# Altium footprint library QFN.PcbLib: 37 footprints (part 1 of 3)
Each footprint in its own frame and in the unit in brackets; x right, y up, seen from the top. Pads: shape width x height; smd on the part's side, far side on the other; paste and mask are expansions set on the pad; w line width, h text height; cw(c..) or ccw(c..) is an arc to the next point about the centre after c.
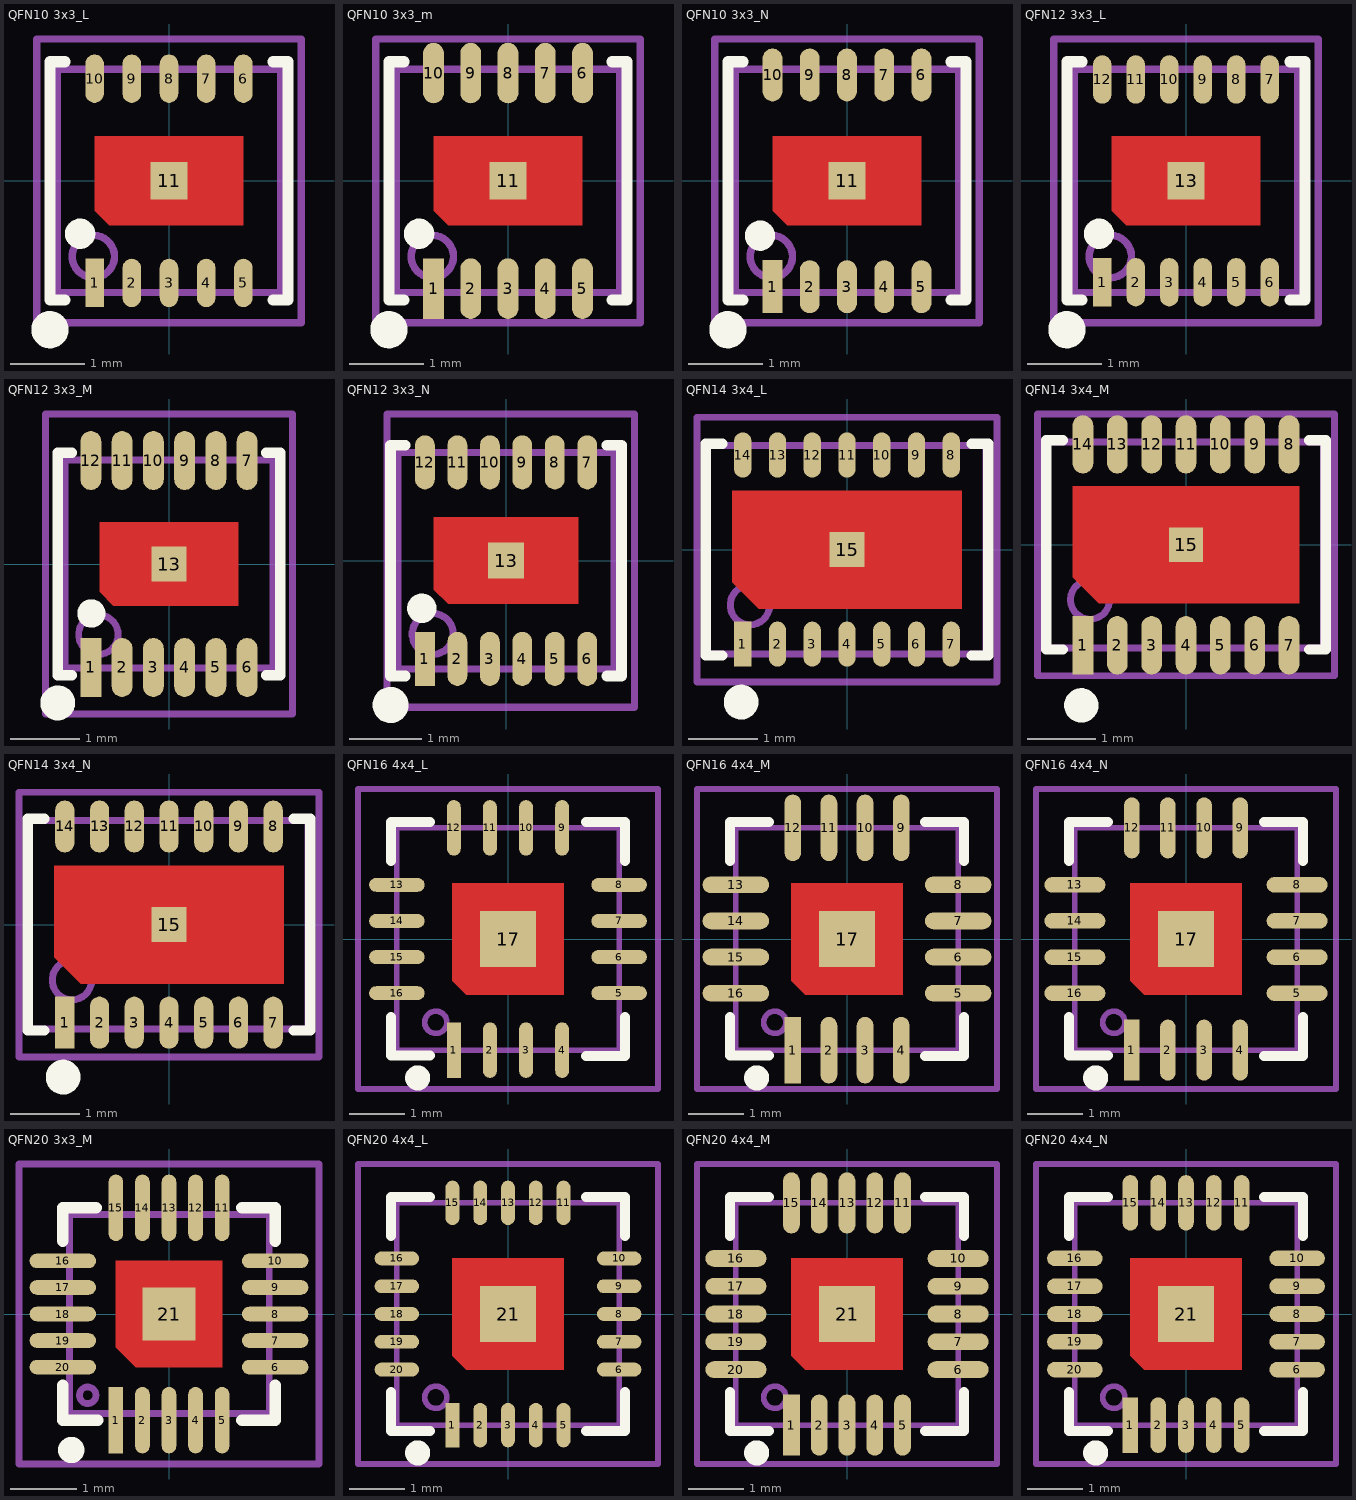
[diagram p0: the footprints below, top view; thin cyan lines are the x and y axes]

## QFN10 3x3_L [mm] "10脚，长x宽x高：3x3x0.6mm，脚距：0.5mm"
pads (11):
  rect 0.25x0.65 smd: 1(-1,-1.372)
  oval 0.25x0.65 smd: 2(-0.5,-1.372) 3(0,-1.372) 4(0.5,-1.372) 5(1,-1.372) 6(1,1.372) 7(0.5,1.372) 8(0,1.372) 9(-0.5,1.372) 10(-1,1.372)
  rect 0.5x0.5 smd: 11(0,0)
Top Layer:
  region: -1,0.6 1,0.6 1,-0.6 -0.8,-0.6 -1,-0.4
Top Overlay:
  circle w0.25: c-1.6,-2 r0.125
  circle w0.203: c-1.194,-0.711 r0.102
  lines w0.15: -1.397,-1.6 -1.6,-1.6 -1.6,1.6 -1.397,1.6 ; 1.397,-1.6 1.6,-1.6 1.6,1.6 1.397,1.6
Top Solder:
  region: -1,0.6 1,0.6 1,-0.6 -0.8,-0.6 -1,-0.4
Mechanical 13:
  circle w0.1: c-1.016,-1.016 r0.284
  lines w0.1: 1.5,-1.5 1.5,1.5 ; 1.5,-1.5 1.5,-1.5 ; 1.5,-1.5 -1.49,-1.5 -1.5,-1.51 -1.5,1.5 1.5,1.5 ; 1.5,1.5 1.5,1.5
Mechanical 15:
  circle w0.05: c0,0 r0.35
  lines w0.05: -0.5,0 0.5,0 ; 0,-0.5 0,0.5
  lines w0.1: -1.778,-1.905 1.778,-1.905 1.778,1.905 -1.778,1.905 -1.778,-1.905
3D body: height 0.63, standoff 0.01, extent -1.5,-1.52 1.5,1.52

## QFN10 3x3_m [mil] "10脚，长x宽x高：3x3x0.6mm，脚距：0.5mm"
pads (11):
  rect 11x32 smd: 1(-39.37,-57)
  oval 11x32 smd: 2(-19.68,-57) 3(0,-57) 4(19.68,-57) 5(39.37,-57) 6(39.37,57) 7(19.68,57) 8(0,57) 9(-19.68,57) 10(-39.37,57)
  rect 19.68x19.68 smd: 11(0,0)
Top Layer:
  region: -39.37,23.62 39.37,23.62 39.37,-23.62 -31.5,-23.62 -39.37,-15.75
Top Overlay:
  circle w8: c-47,-28 r4
  circle w9.84: c-62.99,-78.74 r4.92
  lines w5.91: -55,-62.99 -62.99,-62.99 -62.99,62.99 -55,62.99 ; 55,-62.99 62.99,-62.99 62.99,62.99 55,62.99
Top Solder:
  region: -39.37,23.62 39.37,23.62 39.37,-23.62 -31.5,-23.62 -39.37,-15.75
Mechanical 13:
  circle w3.94: c-40,-40 r11.18
  lines w3.94: 59.06,-59.06 -58.66,-59.06 -59.06,-59.45 -59.06,59.06 59.05,59.06 ; 59.05,-59.05 59.06,-59.06 ; 59.05,-59.05 59.05,59.05 ; 59.05,59.06 59.05,59.05
Mechanical 15:
  circle w1.97: c0,0 r13.78
  lines w1.97: -19.68,0 19.68,0 ; 0,-19.68 0,19.68
  lines w3.94: -70,-75 -70,75 70,75 70,-75 -70,-75
3D body: height 24.8, standoff 0.39, extent -59.06,-59.85 59.05,59.84

## QFN10 3x3_N [mil] "10脚，长x宽x高：3x3x0.6mm，脚距：0.5mm"
pads (11):
  rect 10.5x28 smd: 1(-39.37,-56)
  oval 10.5x28 smd: 2(-19.68,-56) 3(0,-56) 4(19.68,-56) 5(39.37,-56) 6(39.37,56) 7(19.68,56) 8(0,56) 9(-19.68,56) 10(-39.37,56)
  rect 19.68x19.68 smd: 11(0,0)
Top Layer:
  region: -39.37,23.62 39.37,23.62 39.37,-23.62 -31.5,-23.62 -39.37,-15.75
Top Overlay:
  circle w8: c-46,-29 r4
  circle w9.84: c-62.99,-78.74 r4.92
  lines w5.91: -55,-62.99 -62.99,-62.99 -62.99,62.99 -55,62.99 ; 55,-62.99 62.99,-62.99 62.99,62.99 55,62.99
Top Solder:
  region: -39.37,23.62 39.37,23.62 39.37,-23.62 -31.5,-23.62 -39.37,-15.75
Mechanical 13:
  circle w3.94: c-40,-40 r11.18
  lines w3.94: 59.06,-59.06 -58.66,-59.06 -59.06,-59.45 -59.06,59.06 59.05,59.06 ; 59.05,-59.05 59.06,-59.06 ; 59.05,-59.05 59.05,59.05 ; 59.05,59.06 59.05,59.05
Mechanical 15:
  circle w1.97: c0,0 r13.78
  lines w1.97: -19.68,0 19.68,0 ; 0,-19.68 0,19.68
  lines w3.94: -70,-75 -70,75 70,75 70,-75 -70,-75
3D body: height 24.8, standoff 0.39, extent -59.06,-59.85 59.05,59.84

## QFN12 3x3_L [mm] "12脚，长x宽x高：3x3x0.6mm，脚距：0.45mm"
pads (13):
  rect 0.25x0.65 smd: 1(-1.125,-1.362)
  oval 0.25x0.65 smd: 2(-0.675,-1.362) 3(-0.225,-1.362) 4(0.225,-1.362) 5(0.675,-1.362) 6(1.125,-1.362) 7(1.125,1.362) 8(0.675,1.362) 9(0.225,1.362) 10(-0.225,1.362) 11(-0.675,1.362) 12(-1.125,1.362)
  rect 0.5x0.5 smd: 13(0,0)
Top Layer:
  region: -1,0.6 1,0.6 1,-0.6 -0.8,-0.6 -1,-0.4
Top Overlay:
  circle w0.203: c-1.168,-0.711 r0.102
  circle w0.25: c-1.6,-2 r0.125
  lines w0.15: -1.397,-1.6 -1.6,-1.6 -1.6,1.6 -1.397,1.6 ; 1.397,-1.6 1.6,-1.6 1.6,1.6 1.397,1.6
Top Solder:
  region: -1,0.6 1,0.6 1,-0.6 -0.8,-0.6 -1,-0.4
Mechanical 13:
  circle w0.1: c-1.016,-1.016 r0.284
  lines w0.1: 1.5,-1.5 1.5,1.5 ; 1.5,-1.5 1.5,-1.5 ; 1.5,-1.5 -1.49,-1.5 -1.5,-1.51 -1.5,1.5 1.5,1.5 ; 1.5,1.5 1.5,1.5
Mechanical 15:
  circle w0.05: c0,0 r0.35
  lines w0.05: -0.5,0 0.5,0 ; 0,-0.5 0,0.5
  lines w0.1: -1.778,-1.905 1.778,-1.905 1.778,1.905 -1.778,1.905 -1.778,-1.905
3D body: height 0.63, standoff 0, extent -1.5,-1.501 1.5,1.501

## QFN12 3x3_M [mm] "12脚，长x宽x高：3x3x0.6mm，脚距：0.45mm"
pads (13):
  rect 0.3x0.85 smd: 1(-1.125,-1.489)
  oval 0.3x0.85 smd: 2(-0.675,-1.489) 3(-0.225,-1.489) 4(0.225,-1.489) 5(0.675,-1.489) 6(1.125,-1.489) 7(1.125,1.489) 8(0.675,1.489) 9(0.225,1.489) 10(-0.225,1.489) 11(-0.675,1.489) 12(-1.125,1.489)
  rect 0.5x0.5 smd: 13(0,0)
Top Layer:
  region: -1,0.6 1,0.6 1,-0.6 -0.8,-0.6 -1,-0.4
Top Overlay:
  circle w0.203: c-1.118,-0.711 r0.102
  circle w0.25: c-1.6,-2 r0.125
  lines w0.15: -1.397,-1.6 -1.6,-1.6 -1.6,1.6 -1.397,1.6 ; 1.397,-1.6 1.6,-1.6 1.6,1.6 1.397,1.6
Top Solder:
  region: -1,0.6 1,0.6 1,-0.6 -0.8,-0.6 -1,-0.4
Mechanical 13:
  circle w0.1: c-1.016,-1.016 r0.284
  lines w0.1: 1.5,-1.5 -1.49,-1.5 -1.5,-1.51 -1.5,1.5 1.5,1.5 ; 1.5,-1.5 1.5,-1.5 ; 1.5,-1.5 1.5,1.5 ; 1.5,1.5 1.5,1.5
Mechanical 15:
  circle w0.05: c0,0 r0.35
  lines w0.05: -0.5,0 0.5,0 ; 0,-0.5 0,0.5
  lines w0.1: -1.778,-2.159 1.778,-2.159 1.778,2.159 -1.778,2.159 -1.778,-2.159
3D body: height 0.63, standoff 0, extent -1.5,-1.501 1.5,1.501

## QFN12 3x3_N [mm] "12脚，长x宽x高：3x3x0.6mm，脚距：0.45mm"
pads (13):
  rect 0.275x0.75 smd: 1(-1.125,-1.362)
  oval 0.275x0.75 smd: 2(-0.675,-1.362) 3(-0.225,-1.362) 4(0.225,-1.362) 5(0.675,-1.362) 6(1.125,-1.362) 7(1.125,1.362) 8(0.675,1.362) 9(0.225,1.362) 10(-0.225,1.362) 11(-0.675,1.362) 12(-1.125,1.362)
  rect 0.5x0.5 smd: 13(0,0)
Top Layer:
  region: -1,0.6 1,0.6 1,-0.6 -0.8,-0.6 -1,-0.4
Top Overlay:
  circle w0.203: c-1.168,-0.66 r0.102
  circle w0.25: c-1.6,-2 r0.125
  lines w0.15: -1.397,-1.6 -1.6,-1.6 -1.6,1.6 -1.397,1.6 ; 1.397,-1.6 1.6,-1.6 1.6,1.6 1.397,1.6
Top Solder:
  region: -1,0.6 1,0.6 1,-0.6 -0.8,-0.6 -1,-0.4
Mechanical 13:
  circle w0.1: c-1.016,-1.016 r0.284
  lines w0.1: 1.5,-1.5 1.5,1.5 ; 1.5,-1.5 1.5,-1.5 ; 1.5,-1.5 -1.49,-1.5 -1.5,-1.51 -1.5,1.5 1.5,1.5 ; 1.5,1.5 1.5,1.5
Mechanical 15:
  circle w0.05: c0,0 r0.35
  lines w0.05: -0.5,0 0.5,0 ; 0,-0.5 0,0.5
  lines w0.1: -1.651,-2.032 1.778,-2.032 1.778,2.032 -1.651,2.032 -1.651,-2.032
3D body: height 0.63, standoff 0, extent -1.5,-1.501 1.5,1.501

## QFN14 3x4_L [mm] "14脚，长x宽x高：3x4x0.9mm，脚距：0.5mm"
pads (15):
  rect 0.25x0.65 smd: 1(-1.5,-1.361)
  oval 0.25x0.65 smd: 2(-1,-1.361) 3(-0.5,-1.361) 4(0,-1.361) 5(0.5,-1.361) 6(1,-1.361) 7(1.5,-1.361) 8(1.5,1.361) 9(1,1.361) 10(0.5,1.361) 11(0,1.361) 12(-0.5,1.361) 13(-1,1.361) 14(-1.5,1.361)
  rect 0.5x0.5 smd: 15(0,0)
Top Layer:
  region: -1.65,0.85 -1.65,-0.469 -1.269,-0.85 1.65,-0.85 1.65,0.85
Top Overlay:
  circle w0.25: c-1.524,-2.195 r0.125
  lines w0.15: -1.793,-1.524 -2.032,-1.524 -2.032,1.524 -1.793,1.524 ; 1.793,-1.524 2.032,-1.524 2.032,1.524 1.793,1.524
Top Solder:
  region: -1.65,0.85 -1.65,-0.469 -1.269,-0.85 1.65,-0.85 1.65,0.85
Mechanical 13:
  circle w0.1: c-1.397,-0.798 r0.284
  lines w0.1: -2.032,-1.5 -1.49,-1.5 2,-1.5 2,0.682 2.001,0.683 2.001,1.5 -2.032,1.5 -2.032,-1.5
Mechanical 15:
  circle w0.05: c0,0 r0.35
  lines w0.05: -0.5,0 0.5,0 ; 0,-0.5 0,0.5
  lines w0.1: -2.159,-1.905 2.159,-1.905 2.159,1.905 -2.159,1.905 -2.159,-1.905
3D body: height 0.93, standoff 0, extent -2,-1.501 2,1.501

## QFN14 3x4_M [mm] "14脚，长x宽x高：3x4x0.9mm，脚距：0.5mm"
pads (15):
  rect 0.3x0.85 smd: 1(-1.5,-1.462)
  oval 0.3x0.85 smd: 2(-1,-1.462) 3(-0.5,-1.462) 4(0,-1.462) 5(0.5,-1.462) 6(1,-1.462) 7(1.5,-1.462) 8(1.5,1.463) 9(1,1.463) 10(0.5,1.463) 11(0,1.463) 12(-0.5,1.463) 13(-1,1.463) 14(-1.5,1.463)
  rect 0.5x0.5 smd: 15(0,0)
Top Layer:
  region: -1.65,0.85 -1.65,-0.469 -1.269,-0.85 1.65,-0.85 1.65,0.85
Top Overlay:
  circle w0.25: c-1.524,-2.337 r0.125
  lines w0.15: -1.793,-1.524 -2.032,-1.524 -2.032,1.524 -1.793,1.524 ; 1.793,-1.524 2.032,-1.524 2.032,1.524 1.793,1.524
Top Solder:
  region: -1.65,0.85 -1.65,-0.469 -1.269,-0.85 1.65,-0.85 1.65,0.85
Mechanical 13:
  circle w0.1: c-1.397,-0.798 r0.284
  lines w0.1: -2.032,-1.5 -1.49,-1.5 2,-1.5 2,0.682 2.001,0.683 2.001,1.5 -2.032,1.5 -2.032,-1.5
Mechanical 15:
  circle w0.05: c0,0 r0.35
  lines w0.05: -0.5,0 0.5,0 ; 0,-0.5 0,0.5
  lines w0.1: -2.159,-1.905 2.159,-1.905 2.159,1.905 -2.159,1.905 -2.159,-1.905
3D body: height 0.93, standoff 0, extent -2,-1.501 2,1.501

## QFN14 3x4_N [mm] "14脚，长x宽x高：3x4x0.9mm，脚距：0.5mm"
pads (15):
  rect 0.275x0.75 smd: 1(-1.5,-1.412)
  oval 0.275x0.75 smd: 2(-1,-1.412) 3(-0.5,-1.412) 4(0,-1.412) 5(0.5,-1.412) 6(1,-1.412) 7(1.5,-1.412) 8(1.5,1.412) 9(1,1.412) 10(0.5,1.412) 11(0,1.412) 12(-0.5,1.412) 13(-1,1.412) 14(-1.5,1.412)
  rect 0.5x0.5 smd: 15(0,0)
Top Layer:
  region: -1.65,0.85 -1.65,-0.469 -1.269,-0.85 1.65,-0.85 1.65,0.85
Top Overlay:
  circle w0.25: c-1.524,-2.195 r0.125
  lines w0.15: -1.793,-1.524 -2.032,-1.524 -2.032,1.524 -1.793,1.524 ; 1.793,-1.524 2.032,-1.524 2.032,1.524 1.793,1.524
Top Solder:
  region: -1.65,0.85 -1.65,-0.469 -1.269,-0.85 1.65,-0.85 1.65,0.85
Mechanical 13:
  circle w0.1: c-1.397,-0.798 r0.284
  lines w0.1: -2.032,-1.5 -2.032,1.5 2.001,1.5 2.001,0.683 2,0.682 2,-1.5 -1.49,-1.5 -2.032,-1.5
Mechanical 15:
  circle w0.05: c0,0 r0.35
  lines w0.05: -0.5,0 0.5,0 ; 0,-0.5 0,0.5
  lines w0.1: -2.159,-1.905 -2.159,1.905 2.159,1.905 2.159,-1.905 -2.159,-1.905
3D body: height 0.93, standoff 0, extent -2,-1.501 2,1.501

## QFN16 4x4_L [mm] "16脚，长x宽x高：4x4x0.8mm，脚距：0.65mm"
pads (17):
  rect 0.25x1 smd: 1(-0.975,-2)
  oval 0.25x1 smd: 2(-0.325,-2) 3(0.325,-2) 4(0.975,-2) 9(0.975,2) 10(0.325,2) 11(-0.325,2) 12(-0.975,2)
  oval 1x0.25 smd: 5(2,-0.975) 6(2,-0.325) 7(2,0.325) 8(2,0.975) 13(-2,0.975) 14(-2,0.325) 15(-2,-0.325) 16(-2,-0.975)
  rect 1x1 smd: 17(0,0)
Top Layer:
  region: -1,1 1,1 1,-1 -0.75,-1 -1,-0.75
Top Overlay:
  circle w0.25: c-1.625,-2.5 r0.1
  lines w0.178: -2.106,-1.404 -2.106,-2.1 -1.404,-2.1 ; -2.106,1.404 -2.106,2.106 -1.404,2.106 ; 1.404,-2.106 2.106,-2.106 2.106,-1.404 ; 1.404,2.106 2.106,2.106 2.106,1.404
Top Solder:
  region: -1,1 1,1 1,-1 -0.75,-1 -1,-0.75
Mechanical 13:
  circle w0.1: c-1.3,-1.5 r0.2
  lines w0.1: -2,-2 -2,2 2,2 2,-2 -2,-2
Mechanical 15:
  circle w0.05: c0,0 r0.35
  lines w0.05: -0.5,0 0.5,0 ; 0,-0.5 0,0.5
  lines w0.1: -2.7,-2.7 2.7,-2.7 2.7,2.7 -2.7,2.7 -2.7,-2.7
3D body: height 0.75, standoff -0.05, extent -2.01,-2.01 2.01,2.01

## QFN16 4x4_M [mm] "16脚，长x宽x高：4x4x0.8mm，脚距：0.65mm"
pads (17):
  rect 0.3x1.2 smd: 1(-0.975,-2)
  oval 0.3x1.2 smd: 2(-0.325,-2) 3(0.325,-2) 4(0.975,-2) 9(0.975,2) 10(0.325,2) 11(-0.325,2) 12(-0.975,2)
  oval 1.2x0.3 smd: 5(2,-0.975) 6(2,-0.325) 7(2,0.325) 8(2,0.975) 13(-2,0.975) 14(-2,0.325) 15(-2,-0.325) 16(-2,-0.975)
  rect 1x1 smd: 17(0,0)
Top Layer:
  region: -1,1 1,1 1,-1 -0.75,-1 -1,-0.75
Top Overlay:
  circle w0.25: c-1.625,-2.5 r0.1
  lines w0.178: -2.106,-1.404 -2.106,-2.1 -1.404,-2.1 ; -2.106,1.404 -2.106,2.106 -1.404,2.106 ; 1.404,-2.106 2.106,-2.106 2.106,-1.404 ; 1.404,2.106 2.106,2.106 2.106,1.404
Top Solder:
  region: -1,1 1,1 1,-1 -0.75,-1 -1,-0.75
Mechanical 13:
  circle w0.1: c-1.3,-1.5 r0.2
  lines w0.1: -2,-2 2,-2 2,2 -2,2 -2,-2
Mechanical 15:
  circle w0.05: c0,0 r0.35
  lines w0.05: -0.5,0 0.5,0 ; 0,-0.5 0,0.5
  lines w0.1: -2.7,-2.7 -2.7,2.7 2.7,2.7 2.7,-2.7 -2.7,-2.7
3D body: height 0.75, standoff -0.05, extent -2.01,-2.01 2.01,2.01

## QFN16 4x4_N [mm] "16脚，长x宽x高：4x4x0.8mm，脚距：0.65mm"
pads (17):
  rect 0.28x1.1 smd: 1(-0.975,-2)
  oval 0.28x1.1 smd: 2(-0.325,-2) 3(0.325,-2) 4(0.975,-2) 9(0.975,2) 10(0.325,2) 11(-0.325,2) 12(-0.975,2)
  oval 1.1x0.28 smd: 5(2,-0.975) 6(2,-0.325) 7(2,0.325) 8(2,0.975) 13(-2,0.975) 14(-2,0.325) 15(-2,-0.325) 16(-2,-0.975)
  rect 1x1 smd: 17(0,0)
Top Layer:
  region: -1,1 1,1 1,-1 -0.75,-1 -1,-0.75
Top Overlay:
  circle w0.25: c-1.625,-2.5 r0.1
  lines w0.178: -2.106,-1.404 -2.106,-2.1 -1.404,-2.1 ; -2.106,1.404 -2.106,2.106 -1.404,2.106 ; 1.404,-2.106 2.106,-2.106 2.106,-1.404 ; 1.404,2.106 2.106,2.106 2.106,1.404
Top Solder:
  region: -1,1 1,1 1,-1 -0.75,-1 -1,-0.75
Mechanical 13:
  circle w0.1: c-1.3,-1.5 r0.2
  lines w0.1: -2,-2 -2,2 2,2 2,-2 -2,-2
Mechanical 15:
  circle w0.05: c0,0 r0.35
  lines w0.05: -0.5,0 0.5,0 ; 0,-0.5 0,0.5
  lines w0.1: -2.7,-2.7 2.7,-2.7 2.7,2.7 -2.7,2.7 -2.7,-2.7
3D body: height 0.75, standoff -0.05, extent -2.01,-2.01 2.01,2.01

## QFN20 3x3_M [mm] "20脚，长x宽x高：3x3x0.8mm，脚距：0.4mm"
pads (21):
  rect 0.22x1 smd: 1(-0.8,-1.6)
  oval 0.22x1 smd: 2(-0.4,-1.6) 3(0,-1.6) 4(0.4,-1.6) 5(0.8,-1.6) 11(0.8,1.6) 12(0.4,1.6) 13(0,1.6) 14(-0.4,1.6) 15(-0.8,1.6)
  oval 1x0.22 smd: 6(1.6,-0.8) 7(1.6,-0.4) 8(1.6,0) 9(1.6,0.4) 10(1.6,0.8) 16(-1.6,0.8) 17(-1.6,0.4) 18(-1.6,0) 19(-1.6,-0.4) 20(-1.6,-0.8)
  rect 0.8x0.8 smd: 21(0,0)
Top Layer:
  region: -0.8,0.8 0.8,0.8 0.8,-0.8 -0.5,-0.8 -0.8,-0.5
Top Overlay:
  circle w0.25: c-1.473,-2.05 r0.073
  lines w0.178: -1.6,-1.075 -1.6,-1.6 -1.075,-1.6 ; -1.6,1.1 -1.6,1.6 -1.1,1.6 ; 1.1,-1.6 1.6,-1.6 1.6,-1.075 ; 1.1,1.6 1.6,1.6 1.6,1.1
Top Solder:
  region: -0.8,0.8 0.8,0.8 0.8,-0.8 -0.5,-0.8 -0.8,-0.5
Mechanical 13:
  circle w0.1: c-1.225,-1.225 r0.125
  lines w0.1: -1.5,-1.5 -1.5,1.5 1.51,1.5 1.51,-1.5 -1.5,-1.5
Mechanical 15:
  circle w0.05: c0,0 r0.35
  lines w0.05: -0.5,0 0.5,0 ; 0,-0.5 0,0.5
  lines w0.1: -2.261,-2.261 2.261,-2.261 2.261,2.261 -2.261,2.261 -2.261,-2.261
3D body: height 0.75, standoff 0, extent -1.51,-1.51 1.51,1.51

## QFN20 4x4_L [mm] "20脚，长x宽x高：4x4x0.95mm，脚距：0.5mm"
pads (21):
  rect 0.25x0.8 smd: 1(-1,-2)
  oval 0.25x0.8 smd: 2(-0.5,-2) 3(0,-2) 4(0.5,-2) 5(1,-2) 11(1,2) 12(0.5,2) 13(0,2) 14(-0.5,2) 15(-1,2)
  oval 0.8x0.25 smd: 6(2,-1) 7(2,-0.5) 8(2,0) 9(2,0.5) 10(2,1) 16(-2,1) 17(-2,0.5) 18(-2,0) 19(-2,-0.5) 20(-2,-1)
  rect 1x1 smd: 21(0,0)
Top Layer:
  region: -1,1 1,1 1,-1 -0.75,-1 -1,-0.75
Top Overlay:
  circle w0.25: c-1.625,-2.5 r0.1
  lines w0.178: -2.106,-1.404 -2.106,-2.106 -1.404,-2.106 ; -2.106,1.404 -2.106,2.106 -1.404,2.106 ; 1.404,-2.106 2.106,-2.106 2.106,-1.404 ; 1.404,2.106 2.106,2.106 2.106,1.404
Top Solder:
  region: -1,1 1,1 1,-1 -0.75,-1 -1,-0.75
Mechanical 13:
  circle w0.1: c-1.3,-1.5 r0.2
  lines w0.1: -2,-2 2,-2 2,2 -2,2 -2,-2
Mechanical 15:
  circle w0.05: c0,0 r0.35
  lines w0.05: -0.5,0 0.5,0 ; 0,-0.5 0,0.5
  lines w0.1: -2.7,-2.7 -2.7,2.7 2.7,2.7 2.7,-2.7 -2.7,-2.7
3D body: height 0.95, standoff -0.05, extent -2.01,-2.01 2.01,2.01

## QFN20 4x4_M [mm] "20脚，长x宽x高：4x4x0.95mm，脚距：0.5mm"
pads (21):
  rect 0.3x1.1 smd: 1(-1,-2)
  oval 0.3x1.1 smd: 2(-0.5,-2) 3(0,-2) 4(0.5,-2) 5(1,-2) 11(1,2) 12(0.5,2) 13(0,2) 14(-0.5,2) 15(-1,2)
  oval 1.1x0.3 smd: 6(2,-1) 7(2,-0.5) 8(2,0) 9(2,0.5) 10(2,1) 16(-2,1) 17(-2,0.5) 18(-2,0) 19(-2,-0.5) 20(-2,-1)
  rect 1x1 smd: 21(0,0)
Top Layer:
  region: -1,1 1,1 1,-1 -0.75,-1 -1,-0.75
Top Overlay:
  circle w0.25: c-1.625,-2.5 r0.1
  lines w0.178: -2.106,-1.404 -2.106,-2.106 -1.404,-2.106 ; -2.106,1.404 -2.106,2.106 -1.404,2.106 ; 1.404,-2.106 2.106,-2.106 2.106,-1.404 ; 1.404,2.106 2.106,2.106 2.106,1.404
Top Solder:
  region: -1,1 1,1 1,-1 -0.75,-1 -1,-0.75
Mechanical 13:
  circle w0.1: c-1.3,-1.5 r0.2
  lines w0.1: -2,-2 2,-2 2,2 -2,2 -2,-2
Mechanical 15:
  circle w0.05: c0,0 r0.35
  lines w0.05: -0.5,0 0.5,0 ; 0,-0.5 0,0.5
  lines w0.1: -2.7,-2.7 -2.7,2.7 2.7,2.7 2.7,-2.7 -2.7,-2.7
3D body: height 0.95, standoff -0.05, extent -2.01,-2.01 2.01,2.01

## QFN20 4x4_N [mm] "20脚，长x宽x高：4x4x0.95mm，脚距：0.5mm"
pads (21):
  rect 0.28x1 smd: 1(-1,-2)
  oval 0.28x1 smd: 2(-0.5,-2) 3(0,-2) 4(0.5,-2) 5(1,-2) 11(1,2) 12(0.5,2) 13(0,2) 14(-0.5,2) 15(-1,2)
  oval 1x0.28 smd: 6(2,-1) 7(2,-0.5) 8(2,0) 9(2,0.5) 10(2,1) 16(-2,1) 17(-2,0.5) 18(-2,0) 19(-2,-0.5) 20(-2,-1)
  rect 1x1 smd: 21(0,0)
Top Layer:
  region: -1,1 1,1 1,-1 -0.75,-1 -1,-0.75
Top Overlay:
  circle w0.25: c-1.625,-2.5 r0.1
  lines w0.178: -2.106,-1.404 -2.106,-2.106 -1.404,-2.106 ; -2.106,1.404 -2.106,2.106 -1.404,2.106 ; 1.404,-2.106 2.106,-2.106 2.106,-1.404 ; 1.404,2.106 2.106,2.106 2.106,1.404
Top Solder:
  region: -1,1 1,1 1,-1 -0.75,-1 -1,-0.75
Mechanical 13:
  circle w0.1: c-1.3,-1.5 r0.2
  lines w0.1: -2,-2 2,-2 2,2 -2,2 -2,-2
Mechanical 15:
  circle w0.05: c0,0 r0.35
  lines w0.05: -0.5,0 0.5,0 ; 0,-0.5 0,0.5
  lines w0.1: -2.7,-2.7 -2.7,2.7 2.7,2.7 2.7,-2.7 -2.7,-2.7
3D body: height 0.95, standoff -0.05, extent -2.01,-2.01 2.01,2.01